# Altium footprint library MOTHER_BOARD_LS1021_v1.0.PcbLib: 69 footprints (part 3 of 5)
Each footprint in its own frame and in the unit in brackets; x right, y up, seen from the top. Pads: shape width x height; smd on the part's side, far side on the other; paste and mask are expansions set on the pad; w line width, h text height; cw(c..) or ccw(c..) is an arc to the next point about the centre after c.
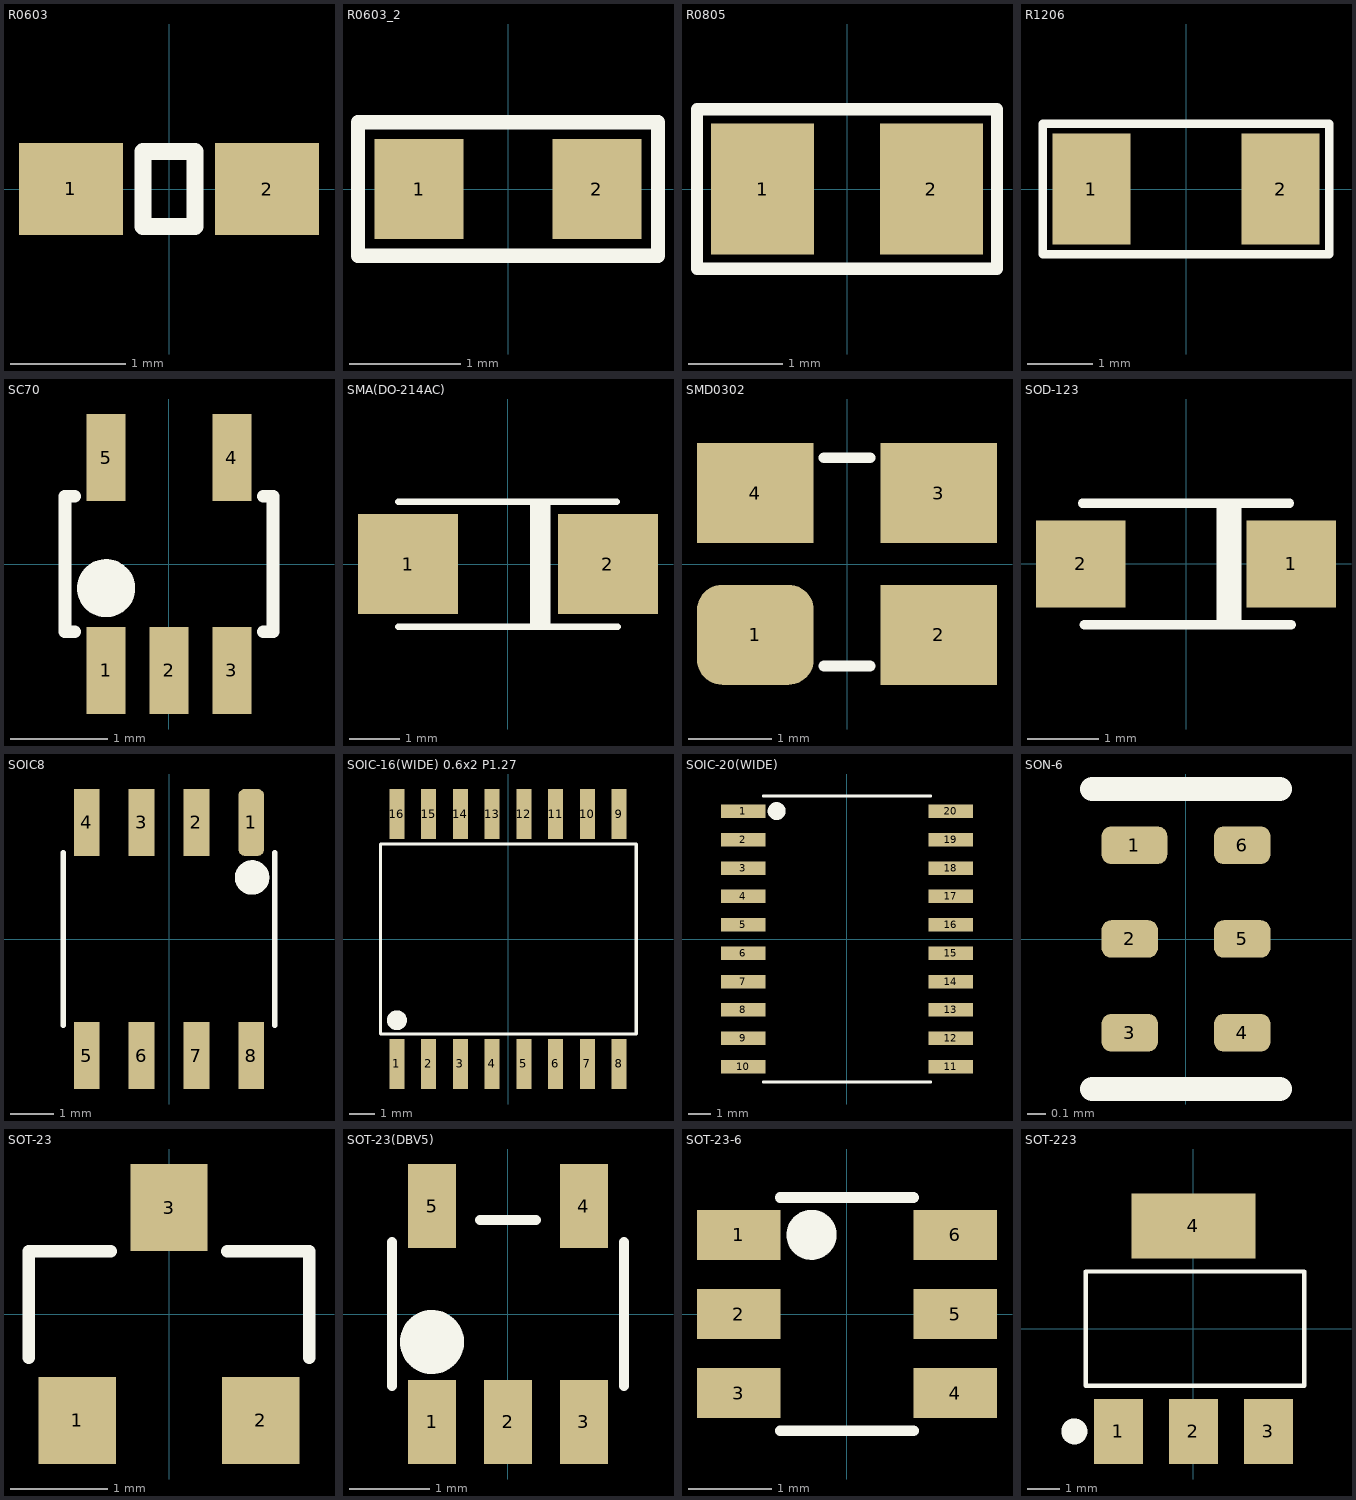
[diagram p2: the footprints below, top view; thin cyan lines are the x and y axes]

## R0603 [mm]
pads (2):
  rect 0.9x0.8 smd paste-0.04 mask+0.05: 1(-0.85,0) 2(0.85,0)
Top Overlay:
  lines w0.15: -0.225,-0.325 -0.225,0.325 0.225,0.325 0.225,-0.325 -0.225,-0.325
3D body "R0603.STEP": height 0.4, standoff 0, extent -0.8,-0.4 0.8,0.4

## R0603_2 [mm]
pads (2):
  rect 0.8x0.9 smd paste-0.05 mask+0.05: 1(-0.8,0) 2(0.8,0)
Top Overlay:
  lines w0.13: -1.35,-0.6 -1.35,0.6 1.35,0.6 1.35,-0.6 -1.35,-0.6
3D body: height 0.55, standoff 0, extent -0.9,-0.45 0.9,0.45

## R0805 [mm] "Р1-12-0,125"
height 0.75
pads (2):
  rect 1.1x1.4 smd paste-0.05 mask+0.05: 1(-0.9,0) 2(0.9,0)
Top Overlay:
  lines w0.13: -1.6,-0.85 1.6,-0.85 1.6,0.85 -1.6,0.85 -1.6,-0.85
3D body "Generic 0805 Chip Resistor.step": height 0.75, standoff 0, extent -1.15,-0.675 1.15,0.675

## R1206 [mm] "Р1-12-0,25"
height 0.8
pads (2):
  rect 1.2x1.7 smd paste-0.05 mask+0.05: 1(-1.45,0) 2(1.45,0)
Top Overlay:
  lines w0.13: -2.2,-1 2.2,-1 2.2,1 -2.2,1 -2.2,-1
3D body "R1206.STEP.step": height 0.85, standoff 0, extent -1.675,-0.865 1.675,0.865

## SC70 [mm]
height 1.1
pads (5):
  rect 0.4x0.9 smd paste-0.025 mask+0.05: 1(-0.65,-1.1) 2(0,-1.1) 3(0.65,-1.1) 4(0.65,1.1) 5(-0.65,1.1)
Top Overlay:
  circle w0.3: c-0.65,-0.25 r0.15
  lines w0.13: -0.975,-0.7 -1.075,-0.7 -1.075,0.7 -0.975,0.7 ; 0.975,-0.7 1.075,-0.7 1.075,0.7 0.975,0.7
3D body: height 1.1, standoff 0.1, extent -1.075,-0.7 1.075,0.7

## SMA(DO-214AC) [mm]
height 14.5
pads (2):
  rect 2x2 smd paste-0.1 mask+0.05: 1(-2,0) 2(2,0)
Top Overlay:
  rectangle: 0.5,-1.25 0.85,1.25
  lines w0.13: -2.2,-1.25 2.2,-1.25 ; -2.2,1.25 2.175,1.25 ; 0.5,1.25 0.5,-1.225 0.525,-1.25
3D body "SMA-DO-214AC.step": height 2.2, standoff 0, extent -2.5,-1.35 2.5,1.35

## SMD0302 [mm]
height 2.7
pads (4):
  rrect50% 1.4x1.2 smd paste-0.05 mask+0.05: 1(-1.1,-0.85)
  rect 1.4x1.2 smd paste-0.05 mask+0.05: 2(1.1,-0.85) 3(1.1,0.85) 4(-1.1,0.85)
Top Overlay:
  lines w0.13: -0.275,-1.225 0.275,-1.225 ; -0.275,1.275 0.275,1.275
3D body "SMD0302.STEP": height 0.8, standoff 0, extent -1.6,-1.225 1.6,1.275

## SOD-123 [mm]
height 2.7
pads (2):
  rect 1.25x1.22 smd paste-0.05 mask+0.05: 1(1.475,0) 2(-1.475,0)
Top Overlay:
  rectangle: 0.425,-0.85 0.775,0.85
  lines w0.13: -1.45,0.85 1.45,0.85 ; -1.425,-0.85 1.475,-0.85
3D body "SOD-123.step": height 1.42, standoff -0.03, extent -1.95,-0.85 1.9,0.85

## SOIC8 [mm]
height 1.6
pads (8):
  rrect50% 0.6x1.55 smd paste-0.08 mask+0.05: 1(1.905,2.7)
  rect 0.6x1.55 smd paste-0.08 mask+0.05: 2(0.635,2.7) 3(-0.635,2.7) 4(-1.905,2.7) 5(-1.905,-2.7) 6(-0.635,-2.7) 7(0.635,-2.7) 8(1.905,-2.7)
Top Overlay:
  circle w0.4: c1.925,1.425 r0.2
  lines w0.13: -2.45,-2 -2.45,2 ; 2.45,-2 2.45,2
3D body "SOIC-8.step": height 1.75, standoff 0, extent -2.445,-2.956 2.455,3.044

## SOIC-16(WIDE) 0.6х2 P1.27 [mm]
height 2.65
pads (16):
  rect 0.6x2 smd paste-0.05 mask+0.05: 1(-4.445,-5) 2(-3.175,-5) 3(-1.905,-5) 4(-0.635,-5) 5(0.635,-5) 6(1.905,-5) 7(3.175,-5) 8(4.445,-5) 9(4.445,5) 10(3.175,5) 11(1.905,5) 12(0.635,5) 13(-0.635,5) 14(-1.905,5) 15(-3.175,5) 16(-4.445,5)
Top Overlay:
  circle w0.4: c-4.445,-3.25 r0.2
  lines w0.13: -5.1,-3.8 5.125,-3.8 5.125,3.8 -5.1,3.8 -5.1,-3.8
3D body "SOIC-16(WIDE).step": height 3.5, standoff 0, extent -5.1,-5.15 5.1,5.15

## SOIC-20(WIDE) [mm]
height 14.5
pads (20):
  rect 2x0.6 smd paste-0.05 mask+0.05: 1(-4.65,5.715) 2(-4.65,4.445) 3(-4.65,3.175) 4(-4.65,1.905) 5(-4.65,0.635) 6(-4.65,-0.635) 7(-4.65,-1.905) 8(-4.65,-3.175) 9(-4.65,-4.445) 10(-4.65,-5.715) 11(4.65,-5.715) 12(4.65,-4.445) 13(4.65,-3.175) 14(4.65,-1.905) 15(4.65,-0.635) 16(4.65,0.635) 17(4.65,1.905) 18(4.65,3.175) 19(4.65,4.445) 20(4.65,5.715)
Top Overlay:
  circle w0.4: c-3.15,5.725 r0.2
  lines w0.13: -3.75,-6.4 3.75,-6.4 ; -3.75,6.4 3.75,6.4
3D body "SO-20 (Wide).step": height 2.7, standoff 0, extent -5.15,-6.4 5.15,6.4

## SON-6 [mm] "LSF0101DRYR"
height 0.6
pads (6):
  rrect50% 0.35x0.2 smd paste+0 mask+0.05: 1(-0.275,0.5)
  rrect50% 0.3x0.2 smd paste+0 mask+0.05: 2(-0.3,0) 3(-0.3,-0.5) 4(0.3,-0.5) 5(0.3,0) 6(0.3,0.5)
Top Overlay:
  lines w0.13: -0.5,-0.8 0.5,-0.8 ; -0.5,0.8 0.5,0.8
3D body "SON6.step": height 0.51, standoff 0, extent -0.505,-0.75 0.495,0.75

## SOT-23 [mm]
height 1.3
pads (3):
  rect 0.8x0.9 smd paste-0.05 mask+0.05: 1(-0.95,-1.1) 2(0.95,-1.1) 3(0,1.1)
Top Overlay:
  lines w0.13: -1.45,-0.45 -1.45,0.65 -0.6,0.65 ; 0.6,0.65 1.45,0.65 1.45,-0.45
3D body "SOT23-3.STEP.step": height 1.3, standoff 0, extent -1.45,-1.4 1.45,1.4

## SOT-23(DBV5) [mm]
height 14.5
pads (5):
  rect 0.6x1.05 smd paste-0.05 mask+0.05: 1(-0.95,-1.35) 2(0,-1.35) 3(0.95,-1.35) 4(0.95,1.35) 5(-0.95,1.35)
Top Overlay:
  circle w0.4: c-0.95,-0.35 r0.2
  lines w0.13: -1.45,-0.9 -1.45,0.9 ; -0.35,1.175 0.35,1.175 ; 1.45,-0.9 1.45,0.9
3D body "SOT-23-5.step": height 1, standoff 0, extent -1.46,-1.17 1.46,1.17

## SOT-23-6 [mm]
height 14.5
pads (6):
  rect 1x0.6 smd paste-0.05 mask+0.05: 1(-1.3,0.95) 2(-1.3,0) 3(-1.3,-0.95) 4(1.3,-0.95) 5(1.3,0) 6(1.3,0.95)
Top Overlay:
  circle w0.3: c-0.425,0.95 r0.15
  lines w0.13: -0.8,-1.4 0.8,-1.4 ; -0.8,1.4 0.8,1.4
3D body "SOT-23-6.step": height 1.09, standoff 0, extent -1.229,-1.4 1.197,1.394

## SOT-223 [mm]
height 1.75
pads (4):
  rect 1.5x2 smd paste-0.05 mask+0.05: 1(-2.3,-3.15) 2(0,-3.15) 3(2.3,-3.15)
  rect 3.8x2 smd paste-0.05 mask+0.05: 4(0,3.15)
Top Overlay:
  circle w0.4: c-3.65,-3.15 r0.2
  lines w0.13: -3.3,-1.75 3.4,-1.75 3.4,1.75 -3.3,1.75 -3.3,-1.75
3D body: height 1.75, standoff 0.1, extent -3.3,-1.75 3.4,1.75